# Altium footprint library Connectors.PcbLib: 178 footprints (part 9 of 12)
Each footprint in its own frame and in the unit in brackets; x right, y up, seen from the top. Pads: shape width x height; smd on the part's side, far side on the other; paste and mask are expansions set on the pad; w line width, h text height; cw(c..) or ccw(c..) is an arc to the next point about the centre after c.
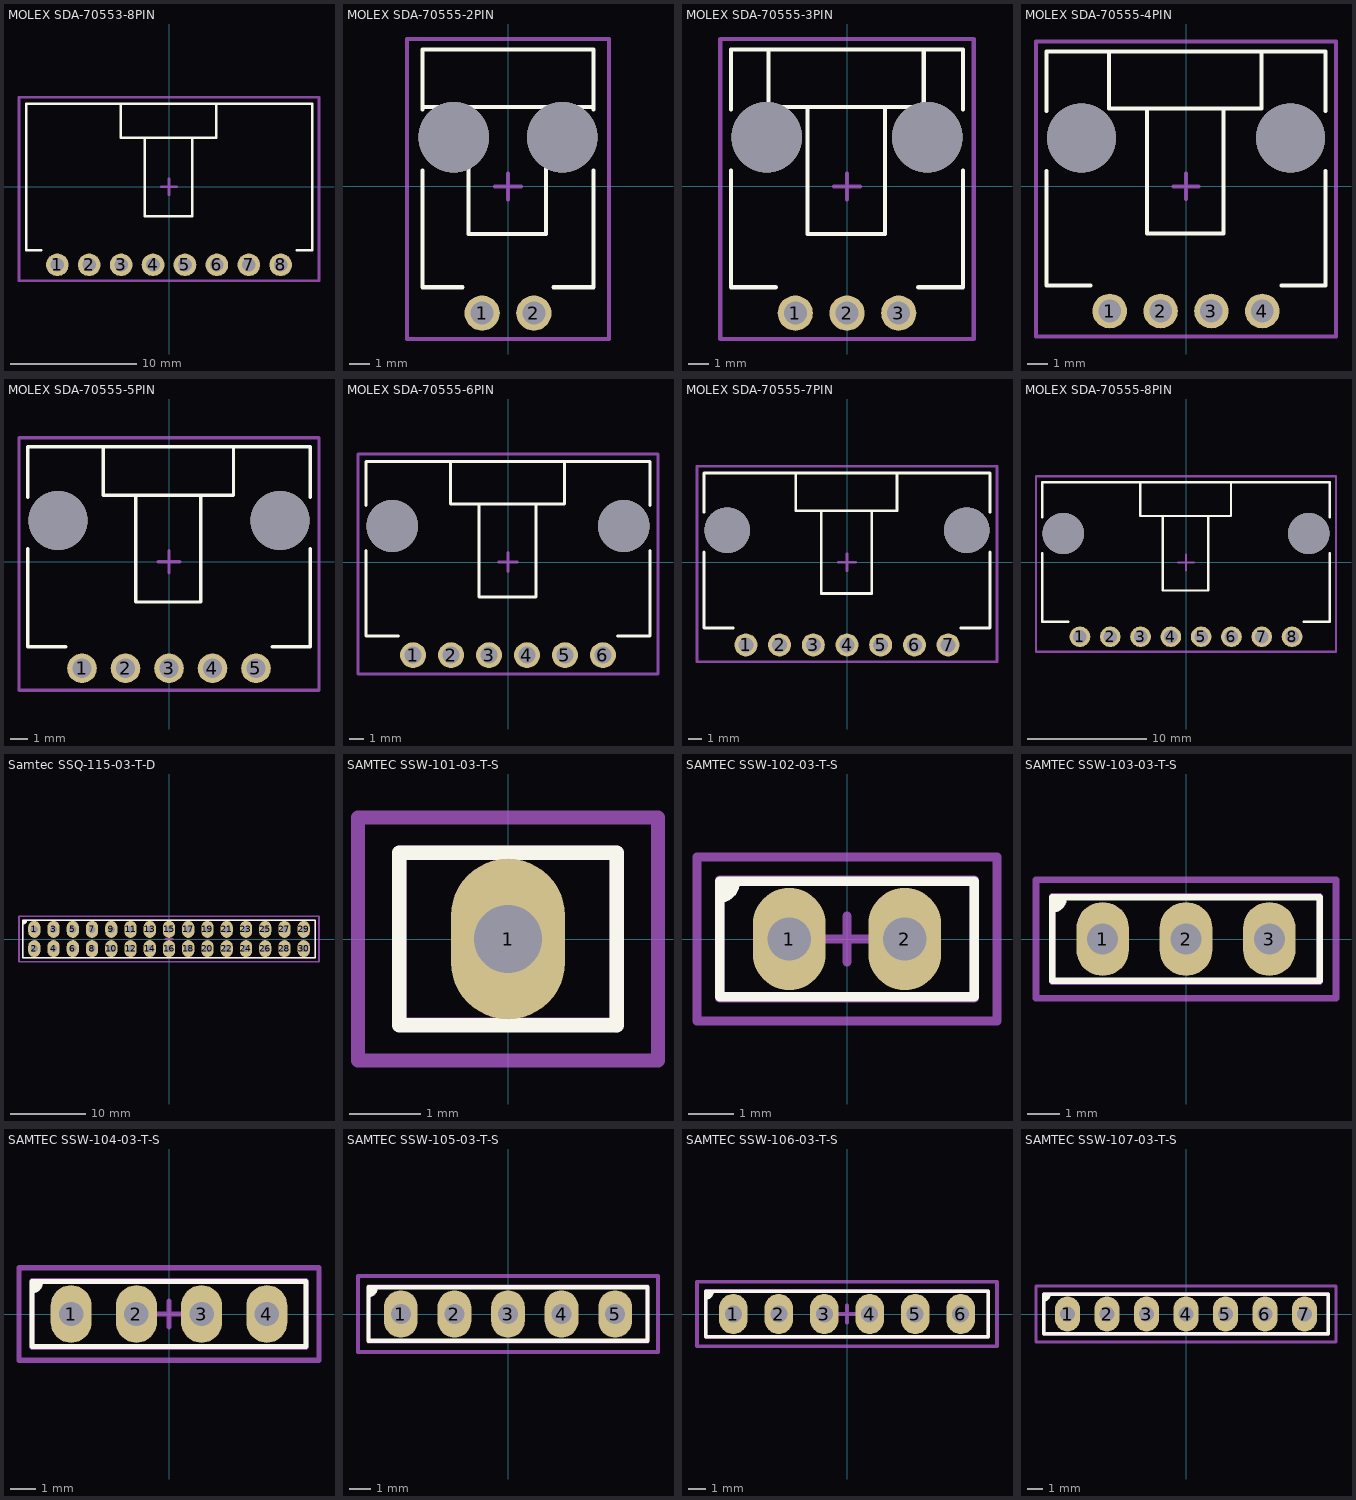
[diagram p8: the footprints below, top view; thin cyan lines are the x and y axes]

## MOLEX SDA-70553-8PIN [mm] "SL Right angle header with latch, 0.100 centres, SDA-70553"
height 6.99
pads (8):
  round 1.8 hole 1.09: 1(-8.89,-6.223) 2(-6.35,-6.223) 3(-3.81,-6.223) 4(-1.27,-6.223) 5(1.27,-6.223) 6(3.81,-6.223) 7(6.35,-6.223) 8(8.89,-6.223)
Top Overlay:
  lines w0.2: -10.16,-5.08 -11.343,-5.08 -11.343,-4.973 -11.343,6.604 11.39,6.604 11.39,-4.973 11.39,-5.08 10.16,-5.08 ; -3.85,6.55 -3.85,3.892 3.77,3.892 3.77,6.55 ; -1.945,3.892 -1.945,-2.346 1.865,-2.346 1.865,3.892
Mechanical 15:
  lines w0.2: -0.635,0 0.635,0 ; 0,-0.635 0,0.635 ; -11.938,-7.493 -11.938,7.112 11.938,7.112 11.938,-7.493 -11.938,-7.493
3D body "705530007.STEP": height 6.96, standoff -3.32, extent -11.39,-6.973 11.47,6.616

## MOLEX SDA-70555-2PIN [mm] "SL Right Angle Header W/LAtch & Trip-Pegs 2.54mm Centres"
height 6.99
pads (2):
  round 1.73 hole 1.13: 1(-1.27,-6.223) 2(1.27,-6.223)
via -2.67,2.417 diameter 3.45 hole 3.45
via 2.67,2.417 diameter 3.45 hole 3.45
Top Overlay:
  lines w0.2: -4.191,0.777 -4.191,-4.953 -2.23,-4.953 ; -4.191,3.777 -4.191,6.731 4.191,6.731 4.191,3.777 ; -4.191,3.892 4.191,3.892 ; -1.945,3.892 -1.945,-2.346 1.865,-2.346 1.865,3.892 ; 2.23,-4.953 4.191,-4.953 4.191,0.777
Mechanical 15:
  lines w0.2: -0.635,0 0.635,0 ; 0,-0.635 0,0.635 ; -4.953,-7.493 -4.953,7.239 4.953,7.239 4.953,-7.493 -4.953,-7.493
3D body "705550001.STEP": height 6.98, standoff -3.3, extent -4.191,-6.923 4.191,6.666

## MOLEX SDA-70555-3PIN [mm] "SL Right Angle Header W/LAtch & Trip-Pegs 2.54mm Centres"
height 6.99
pads (3):
  round 1.73 hole 1.13: 1(-2.54,-6.223) 2(0,-6.223) 3(2.54,-6.223)
via -3.94,2.417 diameter 3.45 hole 3.45
via 3.94,2.417 diameter 3.45 hole 3.45
Top Overlay:
  lines w0.2: -5.7,0.777 -5.7,-4.953 -3.5,-4.953 ; -5.7,3.777 -5.7,6.731 5.7,6.731 5.7,3.777 ; -3.85,6.731 -3.85,3.892 3.77,3.892 3.77,6.731 ; -1.945,3.892 -1.945,-2.346 1.865,-2.346 1.865,3.892 ; 3.5,-4.953 5.7,-4.953 5.7,0.777
Mechanical 15:
  lines w0.2: -0.635,0 0.635,0 ; 0,-0.635 0,0.635 ; -6.223,-7.493 -6.223,7.239 6.223,7.239 6.223,-7.493 -6.223,-7.493
3D body "705550002.STEP": height 6.98, standoff -3.3, extent -5.715,-6.923 5.715,6.666

## MOLEX SDA-70555-4PIN [mm] "SL Right Angle Header W/LAtch & Trip-Pegs 2.54mm Centres"
height 6.99
pads (4):
  round 1.73 hole 1.13: 1(-3.81,-6.223) 2(-1.27,-6.223) 3(1.27,-6.223) 4(3.81,-6.223)
via 5.21,2.417 diameter 3.45 hole 3.45
via -5.21,2.417 diameter 3.45 hole 3.45
Top Overlay:
  lines w0.2: -6.97,0.777 -6.97,-4.953 -4.77,-4.953 ; -6.97,3.777 -6.97,6.731 6.97,6.731 6.97,3.777 ; -3.85,6.731 -3.85,3.892 3.77,3.892 3.77,6.731 ; -1.945,3.892 -1.945,-2.346 1.865,-2.346 1.865,3.892 ; 4.77,-4.953 6.97,-4.953 6.97,0.777
Mechanical 15:
  lines w0.2: -0.635,0 0.635,0 ; 0,-0.635 0,0.635 ; -7.493,-7.493 7.493,-7.493 7.493,7.239 -7.493,7.239 -7.493,-7.493
3D body "705550003.STEP": height 6.98, standoff -3.3, extent -6.985,-6.923 6.985,6.666

## MOLEX SDA-70555-5PIN [mm] "SL Right Angle Header W/LAtch & Trip-Pegs 2.54mm Centres"
height 6.99
pads (5):
  round 1.73 hole 1.13: 1(-5.08,-6.223) 2(-2.54,-6.223) 3(0,-6.223) 4(2.54,-6.223) 5(5.08,-6.223)
via 6.48,2.417 diameter 3.45 hole 3.45
via -6.48,2.417 diameter 3.45 hole 3.45
Top Overlay:
  lines w0.2: -8.24,0.777 -8.24,-4.953 -6.04,-4.953 ; -8.24,3.777 -8.24,6.731 8.24,6.731 8.24,3.777 ; -3.85,6.731 -3.85,3.892 3.77,3.892 3.77,6.731 ; -1.945,3.892 -1.945,-2.346 1.865,-2.346 1.865,3.892 ; 6.04,-4.953 8.24,-4.953 8.24,0.777
Mechanical 15:
  lines w0.2: -0.635,0 0.635,0 ; 0,-0.635 0,0.635 ; -8.763,-7.493 8.763,-7.493 8.763,7.239 -8.763,7.239 -8.763,-7.493
3D body "705550004.STEP": height 6.98, standoff -3.3, extent -8.255,-6.923 8.255,6.666

## MOLEX SDA-70555-6PIN [mm] "SL Right Angle Header W/LAtch & Trip-Pegs 2.54mm Centres"
height 6.99
pads (6):
  round 1.73 hole 1.13: 1(-6.35,-6.223) 2(-3.81,-6.223) 3(-1.27,-6.223) 4(1.27,-6.223) 5(3.81,-6.223) 6(6.35,-6.223)
via 7.75,2.417 diameter 3.45 hole 3.45
via -7.75,2.417 diameter 3.45 hole 3.45
Top Overlay:
  lines w0.2: -9.51,0.777 -9.51,-4.953 -7.31,-4.953 ; -9.51,3.777 -9.51,6.731 9.51,6.731 9.51,3.777 ; -3.85,6.731 -3.85,3.892 3.77,3.892 3.77,6.731 ; -1.945,3.892 -1.945,-2.346 1.865,-2.346 1.865,3.892 ; 7.31,-4.953 9.51,-4.953 9.51,0.777
Mechanical 15:
  lines w0.2: -0.635,0 0.635,0 ; 0,-0.635 0,0.635 ; -10.033,-7.493 10.033,-7.493 10.033,7.239 -10.033,7.239 -10.033,-7.493
3D body "705550005.STEP": height 6.98, standoff -3.3, extent -9.525,-6.923 9.525,6.666

## MOLEX SDA-70555-7PIN [mm] "SL Right Angle Header W/LAtch & Trip-Pegs 2.54mm Centres"
height 6.99
pads (7):
  round 1.73 hole 1.13: 1(-7.62,-6.223) 2(-5.08,-6.223) 3(-2.54,-6.223) 4(0,-6.223) 5(2.54,-6.223) 6(5.08,-6.223) 7(7.62,-6.223)
via -9.02,2.417 diameter 3.45 hole 3.45
via 9.02,2.417 diameter 3.45 hole 3.45
Top Overlay:
  lines w0.2: -10.78,0.777 -10.78,-4.953 -8.58,-4.953 ; -10.78,3.777 -10.78,6.731 10.78,6.731 10.78,3.777 ; -3.85,6.731 -3.85,3.892 3.77,3.892 3.77,6.731 ; -1.945,3.892 -1.945,-2.346 1.865,-2.346 1.865,3.892 ; 8.58,-4.953 10.78,-4.953 10.78,0.777
Mechanical 15:
  lines w0.2: -0.635,0 0.635,0 ; 0,-0.635 0,0.635 ; -11.303,-7.493 -11.303,7.239 11.303,7.239 11.303,-7.493 -11.303,-7.493
3D body "705550006.STEP": height 6.98, standoff -3.3, extent -10.795,-6.923 10.795,6.666

## MOLEX SDA-70555-8PIN [mm] "SL Right Angle Header W/LAtch & Trip-Pegs 2.54mm Centres"
height 6.99
pads (8):
  round 1.73 hole 1.13: 1(-8.89,-6.223) 2(-6.35,-6.223) 3(-3.81,-6.223) 4(-1.27,-6.223) 5(1.27,-6.223) 6(3.81,-6.223) 7(6.35,-6.223) 8(8.89,-6.223)
via -10.29,2.417 diameter 3.45 hole 3.45
via 10.29,2.417 diameter 3.45 hole 3.45
Top Overlay:
  lines w0.2: -12.05,0.777 -12.05,-4.953 -9.85,-4.953 ; -12.05,3.777 -12.05,6.731 12.05,6.731 12.05,3.777 ; -3.85,6.731 -3.85,3.892 3.77,3.892 3.77,6.731 ; -1.945,3.892 -1.945,-2.346 1.865,-2.346 1.865,3.892 ; 9.85,-4.953 12.05,-4.953 12.05,0.777
Mechanical 15:
  lines w0.2: -0.635,0 0.635,0 ; 0,-0.635 0,0.635 ; -12.573,-7.493 -12.573,7.239 12.573,7.239 12.573,-7.493 -12.573,-7.493
3D body "705550007.STEP": height 6.98, standoff -3.3, extent -12.065,-6.923 12.065,6.666

## Samtec SSQ-115-03-T-D [mm]
height 8.51
pads (30):
  oval 1.6x2.25 hole 0.95: 1(-17.78,1.27) 2(-17.78,-1.27) 3(-15.24,1.27) 4(-15.24,-1.27) 5(-12.7,1.27) 6(-12.7,-1.27) 7(-10.16,1.27) 8(-10.16,-1.27) 9(-7.62,1.27) 10(-7.62,-1.27) 11(-5.08,1.27) 12(-5.08,-1.27) 13(-2.54,1.27) 14(-2.54,-1.27) 15(0,1.27) 16(0,-1.27) 17(2.54,1.27) 18(2.54,-1.27) 19(5.08,1.27) 20(5.08,-1.27) 21(7.62,1.27) 22(7.62,-1.27) 23(10.16,1.27) 24(10.16,-1.27) 25(12.7,1.27) 26(12.7,-1.27) 27(15.24,1.27) 28(15.24,-1.27) 29(17.78,1.27) 30(17.78,-1.27)
Top Overlay:
  region: -19.3,2.5 -18.8,2.5 -18.8,2.3 -19.1,2 -19.3,2
  lines w0.2: -19.3,2 ccw(c-19.3,2.5) -18.8,2.5 ; -19.3,-2.5 19.3,-2.5 19.3,2.5 -19.3,2.5 -19.3,-2.5
Mechanical 13:
  lines w0.2: -19.304,-2.476 -19.304,2.477 19.304,2.477 19.304,-2.476 -19.304,-2.476
Mechanical 15:
  lines w0.2: -0.5,0 0.5,0 ; 0,-0.5 0,0.5 ; -19.8,-3 -19.8,3 19.8,3 19.8,-3 -19.8,-3
3D body "Samtec SSQ-115-03-T-D.STEP": height 8.51, standoff -10.01, extent -19.304,-2.476 19.304,2.477

## SAMTEC SSW-101-03-T-S [mm]
height 8.51
pads (1):
  oval 1.6x2.25 hole 0.95: 1(0,0)
Top Overlay:
  lines w0.2: 1.524,-1.2 1.524,-1.206 ; 1.524,-1.206 -1.524,-1.206 -1.524,1.207 1.524,1.207 1.524,-1.206
Mechanical 13:
  lines w0.2: 1.524,-1.206 1.524,1.207 -1.524,1.207 -1.524,-1.2 1.524,-1.2
Mechanical 15:
  lines w0.2: -0.5,0 0.5,0 ; 0,-0.5 0,0.5 ; -2.1,-1.7 2.1,-1.7 2.1,1.7 -2.1,1.7 -2.1,-1.7
3D body "Samtec-SSW-101-03-T-S.STEP": height 8.51, standoff -10.01, extent -1.524,-1.206 1.524,1.207

## SAMTEC SSW-102-03-T-S [mm]
height 8.51
pads (2):
  oval 1.6x2.25 hole 0.95: 1(-1.27,0) 2(1.27,0)
Top Overlay:
  region: -2.8,1.27 -2.46,1.27 -2.46,1.1 -2.66,0.9 -2.8,0.9
  lines w0.2: -2.8,0.9 ccw(c-2.8,1.24) -2.46,1.24 -2.46,1.27 ; -2.8,-1.27 -2.8,1.27 2.8,1.27 2.8,-1.27 -2.8,-1.27
Mechanical 13:
  lines w0.2: -2.8,-1.3 2.8,-1.3 2.8,1.3 -2.8,1.3 -2.8,-1.3
Mechanical 15:
  lines w0.2: -0.5,0 0.5,0 ; 0,-0.5 0,0.5 ; -3.3,-1.8 -3.3,1.8 3.3,1.8 3.3,-1.8 -3.3,-1.8
3D body "Samtec-SSW-102-03-T-S.STEP": height 8.51, standoff -10.01, extent -2.794,-1.206 2.794,1.207

## SAMTEC SSW-103-03-T-S [mm]
height 8.51
pads (3):
  oval 1.6x2.25 hole 0.95: 1(-2.54,0) 2(0,0) 3(2.54,0)
Top Overlay:
  region: -4.07,1.27 -3.73,1.27 -3.73,1.1 -3.93,0.9 -4.07,0.9
  lines w0.2: -4.07,0.9 ccw(c-4.07,1.24) -3.73,1.24 -3.73,1.27 ; -4.07,-1.27 4.07,-1.27 4.07,1.27 -4.07,1.27 -4.07,-1.27
Mechanical 13:
  lines w0.2: -4.07,-1.3 -4.07,1.3 4.07,1.3 4.07,-1.3 -4.07,-1.3
Mechanical 15:
  lines w0.2: -0.5,0 0.5,0 ; 0,-0.5 0,0.5 ; -4.57,-1.8 4.57,-1.8 4.57,1.8 -4.57,1.8 -4.57,-1.8
3D body "Samtec-SSW-103-03-T-S.STEP": height 8.51, standoff -10.01, extent -4.064,-1.206 4.064,1.207

## SAMTEC SSW-104-03-T-S [mm]
height 8.51
pads (4):
  oval 1.6x2.25 hole 0.95: 1(-3.81,0) 2(-1.27,0) 3(1.27,0) 4(3.81,0)
Top Overlay:
  region: -5.34,1.27 -5,1.27 -5,1.1 -5.2,0.9 -5.34,0.9
  lines w0.2: -5.34,0.9 ccw(c-5.34,1.24) -5,1.24 -5,1.27 ; -5.34,-1.27 5.34,-1.27 5.34,1.27 -5.34,1.27 -5.34,-1.27
Mechanical 13:
  lines w0.2: -5.34,-1.3 -5.34,1.3 5.34,1.3 5.34,-1.3 -5.34,-1.3
Mechanical 15:
  lines w0.2: -0.5,0 0.5,0 ; 0,-0.5 0,0.5 ; -5.84,-1.8 5.84,-1.8 5.84,1.8 -5.84,1.8 -5.84,-1.8
3D body "Samtec-SSW-104-03-T-S.STEP": height 8.51, standoff -10.01, extent -5.334,-1.206 5.334,1.207

## SAMTEC SSW-105-03-T-S [mm]
height 8.51
pads (5):
  oval 1.6x2.25 hole 0.95: 1(-5.08,0) 2(-2.54,0) 3(0,0) 4(2.54,0) 5(5.08,0)
Top Overlay:
  region: -6.61,1.27 -6.27,1.27 -6.27,1.1 -6.47,0.9 -6.61,0.9
  lines w0.2: -6.61,0.9 ccw(c-6.61,1.24) -6.27,1.24 -6.27,1.27 ; -6.61,-1.27 -6.61,1.27 6.61,1.27 6.61,-1.27 -6.61,-1.27
Mechanical 13:
  lines w0.2: -6.61,-1.3 6.61,-1.3 6.61,1.3 -6.61,1.3 -6.61,-1.3
Mechanical 15:
  lines w0.2: -0.5,0 0.5,0 ; 0,-0.5 0,0.5 ; -7.11,-1.8 -7.11,1.8 7.11,1.8 7.11,-1.8 -7.11,-1.8
3D body "Samtec-SSW-105-03-T-S.STEP": height 8.51, standoff -10.01, extent -6.604,-1.206 6.604,1.207

## SAMTEC SSW-106-03-T-S [mm]
height 8.51
pads (6):
  oval 1.6x2.25 hole 0.95: 1(-6.35,0) 2(-3.81,0) 3(-1.27,0) 4(1.27,0) 5(3.81,0) 6(6.35,0)
Top Overlay:
  region: -7.88,1.27 -7.54,1.27 -7.54,1.1 -7.74,0.9 -7.88,0.9
  lines w0.2: -7.88,0.9 ccw(c-7.88,1.24) -7.54,1.24 -7.54,1.27 ; -7.88,-1.27 7.88,-1.27 7.88,1.27 -7.88,1.27 -7.88,-1.27
Mechanical 13:
  lines w0.2: -7.88,-1.3 -7.88,1.3 7.88,1.3 7.88,-1.3 -7.88,-1.3
Mechanical 15:
  lines w0.2: -0.5,0 0.5,0 ; 0,-0.5 0,0.5 ; -8.38,-1.8 8.38,-1.8 8.38,1.8 -8.38,1.8 -8.38,-1.8
3D body "Samtec-SSW-106-03-T-S.STEP": height 8.51, standoff -10.01, extent -7.874,-1.206 7.874,1.207

## SAMTEC SSW-107-03-T-S [mm]
height 8.51
pads (7):
  oval 1.6x2.25 hole 0.95: 1(-7.62,0) 2(-5.08,0) 3(-2.54,0) 4(0,0) 5(2.54,0) 6(5.08,0) 7(7.62,0)
Top Overlay:
  region: -9.15,1.27 -8.81,1.27 -8.81,1.1 -9.01,0.9 -9.15,0.9
  lines w0.2: -9.15,0.9 ccw(c-9.15,1.24) -8.81,1.24 -8.81,1.27 ; -9.15,-1.27 -9.15,1.27 9.15,1.27 9.15,-1.27 -9.15,-1.27
Mechanical 13:
  lines w0.2: -9.15,-1.3 9.15,-1.3 9.15,1.3 -9.15,1.3 -9.15,-1.3
Mechanical 15:
  lines w0.2: -0.5,0 0.5,0 ; 0,-0.5 0,0.5 ; -9.65,-1.8 -9.65,1.8 9.65,1.8 9.65,-1.8 -9.65,-1.8
3D body "Samtec-SSW-107-03-T-S.STEP": height 8.51, standoff -10.01, extent -9.144,-1.206 9.144,1.207